# Altium footprint library con-samtec.PCBLIB: 805 footprints (part 52 of 55)
Each footprint in its own frame and in the unit in brackets; x right, y up, seen from the top. Pads: shape width x height; smd on the part's side, far side on the other; paste and mask are expansions set on the pad; w line width, h text height; cw(c..) or ccw(c..) is an arc to the next point about the centre after c.
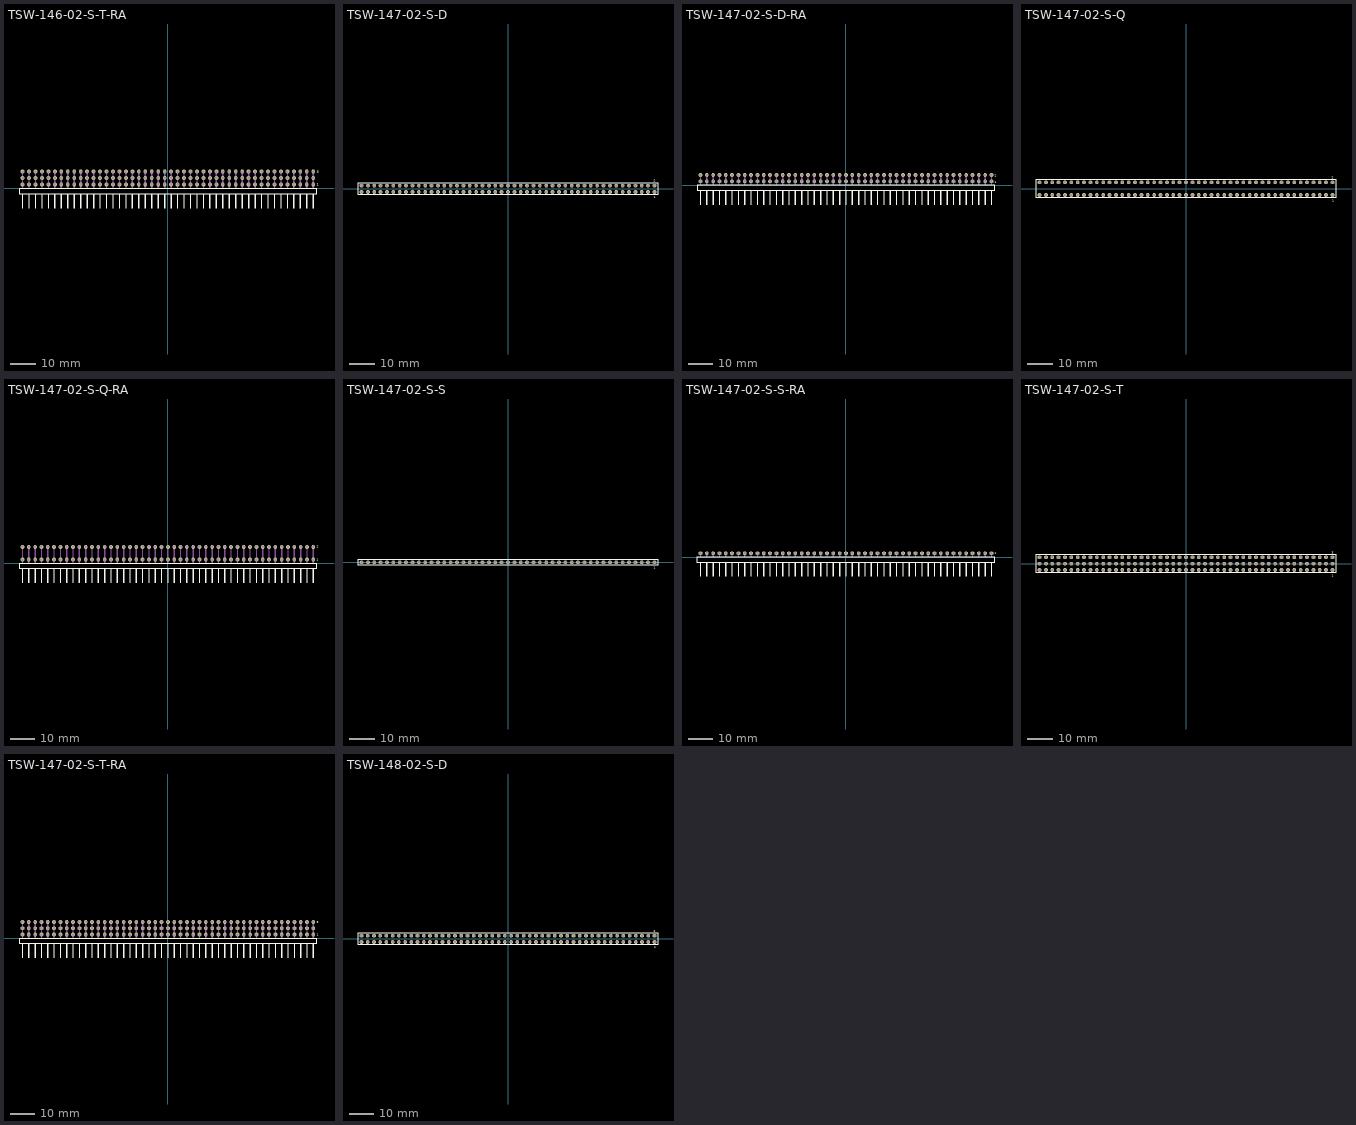
[diagram p51: the footprints below, top view; thin cyan lines are the x and y axes]

## TSW-146-02-S-T-RA [mil]
pads (138):
  oct 59.06x59.06 hole 39.37: 1(2250,60) 2(2250,160) 3(2250,260) 4(2150,60) 5(2150,160) 6(2150,260) 7(2050,60) 8(2050,160) 9(2050,260) 10(1950,60) 11(1950,160) 12(1950,260) 13(1850,60) 14(1850,160) 15(1850,260) 16(1750,60) 17(1750,160) 18(1750,260) 19(1650,60) 20(1650,160) 21(1650,260) 22(1550,60) 23(1550,160) 24(1550,260) 25(1450,60) 26(1450,160) 27(1450,260) 28(1350,60) 29(1350,160) 30(1350,260) 31(1250,60) 32(1250,160) 33(1250,260) 34(1150,60) 35(1150,160) 36(1150,260) 37(1050,60) 38(1050,160) 39(1050,260) 40(950,60) 41(950,160) 42(950,260) 43(850,60) 44(850,160) 45(850,260) 46(750,60) 47(750,160) 48(750,260) 49(650,60) 50(650,160) 51(650,260) 52(550,60) 53(550,160) 54(550,260) 55(450,60) 56(450,160) 57(450,260) 58(350,60) 59(350,160) 60(350,260) 61(250,60) 62(250,160) 63(250,260) 64(150,60) 65(150,160) 66(150,260) 67(50,60) 68(50,160) 69(50,260) 70(-50,60) 71(-50,160) 72(-50,260) 73(-150,60) 74(-150,160) 75(-150,260) 76(-250,60) 77(-250,160) 78(-250,260) 79(-350,60) 80(-350,160) 81(-350,260) 82(-450,60) 83(-450,160) 84(-450,260) 85(-550,60) 86(-550,160) 87(-550,260) 88(-650,60) 89(-650,160) 90(-650,260) 91(-750,60) 92(-750,160) 93(-750,260) 94(-850,60) 95(-850,160) 96(-850,260) 97(-950,60) 98(-950,160) 99(-950,260) 100(-1050,60) 101(-1050,160) 102(-1050,260) 103(-1150,60) 104(-1150,160) 105(-1150,260) 106(-1250,60) 107(-1250,160) 108(-1250,260) 109(-1350,60) 110(-1350,160) 111(-1350,260) 112(-1450,60) 113(-1450,160) 114(-1450,260) 115(-1550,60) 116(-1550,160) 117(-1550,260) 118(-1650,60) 119(-1650,160) 120(-1650,260) 121(-1750,60) 122(-1750,160) 123(-1750,260) 124(-1850,60) 125(-1850,160) 126(-1850,260) 127(-1950,60) 128(-1950,160) 129(-1950,260) 130(-2050,60) 131(-2050,160) 132(-2050,260) 133(-2150,60) 134(-2150,160) 135(-2150,260) 136(-2250,60) 137(-2250,160) 138(-2250,260)
Top Overlay:
  rectangle: -2260,-310.63 -2240,-80.32
  rectangle: -2160,-310.63 -2140,-80.32
  rectangle: -2060,-310.63 -2040,-80.32
  rectangle: -1960,-310.63 -1940,-80.32
  rectangle: -1860,-310.63 -1840,-80.32
  rectangle: -1760,-310.63 -1740,-80.32
  rectangle: -1660,-310.63 -1640,-80.32
  rectangle: -1560,-310.63 -1540,-80.32
  rectangle: -1460,-310.63 -1440,-80.32
  rectangle: -1360,-310.63 -1340,-80.32
  rectangle: -1260,-310.63 -1240,-80.32
  rectangle: -1160,-310.63 -1140,-80.32
  rectangle: -1060,-310.63 -1040,-80.32
  rectangle: -960,-310.63 -940,-80.32
  rectangle: -860,-310.63 -840,-80.32
  rectangle: -760,-310.63 -740,-80.32
  rectangle: -660,-310.63 -640,-80.32
  rectangle: -560,-310.63 -540,-80.32
  rectangle: -460,-310.63 -440,-80.32
  rectangle: -360,-310.63 -340,-80.32
  rectangle: -260,-310.63 -240,-80.32
  rectangle: -160,-310.63 -140,-80.32
  rectangle: -60,-310.63 -40,-80.32
  rectangle: 40,-310.63 60,-80.32
  rectangle: 140,-310.63 160,-80.32
  rectangle: 240,-310.63 260,-80.32
  rectangle: 340,-310.63 360,-80.32
  rectangle: 440,-310.63 460,-80.32
  rectangle: 540,-310.63 560,-80.32
  rectangle: 640,-310.63 660,-80.32
  rectangle: 740,-310.63 760,-80.32
  rectangle: 840,-310.63 860,-80.32
  rectangle: 940,-310.63 960,-80.32
  rectangle: 1040,-310.63 1060,-80.32
  rectangle: 1140,-310.63 1160,-80.32
  rectangle: 1240,-310.63 1260,-80.32
  rectangle: 1340,-310.63 1360,-80.32
  rectangle: 1440,-310.63 1460,-80.32
  rectangle: 1540,-310.63 1560,-80.32
  rectangle: 1640,-310.63 1660,-80.32
  rectangle: 1740,-310.63 1760,-80.32
  rectangle: 1840,-310.63 1860,-80.32
  rectangle: 1940,-310.63 1960,-80.32
  rectangle: 2040,-310.63 2060,-80.32
  rectangle: 2140,-310.63 2160,-80.32
  rectangle: 2240,-310.63 2260,-80.32
  lines w8: -2305.08,-80.55 2305.08,-80.55 2305.08,-4.17 -2305.08,-4.17 -2305.08,-80.55
  text "1" at 2301.57,41.34 h36.81
  text "3" at 2302.17,236.81 h36.81
Mechanical 16:
  rectangle: -2260,0 -2240,270
  rectangle: -2160,0 -2140,270
  rectangle: -2060,0 -2040,270
  rectangle: -1960,0 -1940,270
  rectangle: -1860,0 -1840,270
  rectangle: -1760,0 -1740,270
  rectangle: -1660,0 -1640,270
  rectangle: -1560,0 -1540,270
  rectangle: -1460,0 -1440,270
  rectangle: -1360,0 -1340,270
  rectangle: -1260,0 -1240,270
  rectangle: -1160,0 -1140,270
  rectangle: -1060,0 -1040,270
  rectangle: -960,0 -940,270
  rectangle: -860,0 -840,270
  rectangle: -760,0 -740,270
  rectangle: -660,0 -640,270
  rectangle: -560,0 -540,270
  rectangle: -460,0 -440,270
  rectangle: -360,0 -340,270
  rectangle: -260,0 -240,270
  rectangle: -160,0 -140,270
  rectangle: -60,0 -40,270
  rectangle: 40,0 60,270
  rectangle: 140,0 160,270
  rectangle: 240,0 260,270
  rectangle: 340,0 360,270
  rectangle: 440,0 460,270
  rectangle: 540,0 560,270
  rectangle: 640,0 660,270
  rectangle: 740,0 760,270
  rectangle: 840,0 860,270
  rectangle: 940,0 960,270
  rectangle: 1040,0 1060,270
  rectangle: 1140,0 1160,270
  rectangle: 1240,0 1260,270
  rectangle: 1340,0 1360,270
  rectangle: 1440,0 1460,270
  rectangle: 1540,0 1560,270
  rectangle: 1640,0 1660,270
  rectangle: 1740,0 1760,270
  rectangle: 1840,0 1860,270
  rectangle: 1940,0 1960,270
  rectangle: 2040,0 2060,270
  rectangle: 2140,0 2160,270
  rectangle: 2240,0 2260,270

## TSW-147-02-S-D [mm]
pads (94):
  oct 1.5x1.5 hole 1: 1(58.42,-1.27) 2(58.42,1.27) 3(55.88,-1.27) 4(55.88,1.27) 5(53.34,-1.27) 6(53.34,1.27) 7(50.8,-1.27) 8(50.8,1.27) 9(48.26,-1.27) 10(48.26,1.27) 11(45.72,-1.27) 12(45.72,1.27) 13(43.18,-1.27) 14(43.18,1.27) 15(40.64,-1.27) 16(40.64,1.27) 17(38.1,-1.27) 18(38.1,1.27) 19(35.56,-1.27) 20(35.56,1.27) 21(33.02,-1.27) 22(33.02,1.27) 23(30.48,-1.27) 24(30.48,1.27) 25(27.94,-1.27) 26(27.94,1.27) 27(25.4,-1.27) 28(25.4,1.27) 29(22.86,-1.27) 30(22.86,1.27) 31(20.32,-1.27) 32(20.32,1.27) 33(17.78,-1.27) 34(17.78,1.27) 35(15.24,-1.27) 36(15.24,1.27) 37(12.7,-1.27) 38(12.7,1.27) 39(10.16,-1.27) 40(10.16,1.27) 41(7.62,-1.27) 42(7.62,1.27) 43(5.08,-1.27) 44(5.08,1.27) 45(2.54,-1.27) 46(2.54,1.27) 47(0,-1.27) 48(0,1.27) 49(-2.54,-1.27) 50(-2.54,1.27) 51(-5.08,-1.27) 52(-5.08,1.27) 53(-7.62,-1.27) 54(-7.62,1.27) 55(-10.16,-1.27) 56(-10.16,1.27) 57(-12.7,-1.27) 58(-12.7,1.27) 59(-15.24,-1.27) 60(-15.24,1.27) 61(-17.78,-1.27) 62(-17.78,1.27) 63(-20.32,-1.27) 64(-20.32,1.27) 65(-22.86,-1.27) 66(-22.86,1.27) 67(-25.4,-1.27) 68(-25.4,1.27) 69(-27.94,-1.27) 70(-27.94,1.27) 71(-30.48,-1.27) 72(-30.48,1.27) 73(-33.02,-1.27) 74(-33.02,1.27) 75(-35.56,-1.27) 76(-35.56,1.27) 77(-38.1,-1.27) 78(-38.1,1.27) 79(-40.64,-1.27) 80(-40.64,1.27) 81(-43.18,-1.27) 82(-43.18,1.27) 83(-45.72,-1.27) 84(-45.72,1.27) 85(-48.26,-1.27) 86(-48.26,1.27) 87(-50.8,-1.27) 88(-50.8,1.27) 89(-53.34,-1.27) 90(-53.34,1.27) 91(-55.88,-1.27) 92(-55.88,1.27) 93(-58.42,-1.27) 94(-58.42,1.27)
Top Overlay:
  lines w0.203: -59.819,-2.425 59.819,-2.425 59.819,2.425 -59.819,2.425 -59.819,-2.425
  text "1" at 58.212,-3.818 h0.94
  text "2" at 58.037,2.744 h0.94
Mechanical 16:
  rectangle: -58.77,-1.62 -58.07,-0.92
  rectangle: -58.77,0.92 -58.07,1.62
  rectangle: -56.23,-1.62 -55.53,-0.92
  rectangle: -56.23,0.92 -55.53,1.62
  rectangle: -53.69,-1.62 -52.99,-0.92
  rectangle: -53.69,0.92 -52.99,1.62
  rectangle: -51.15,-1.62 -50.45,-0.92
  rectangle: -51.15,0.92 -50.45,1.62
  rectangle: -48.61,-1.62 -47.91,-0.92
  rectangle: -48.61,0.92 -47.91,1.62
  rectangle: -46.07,-1.62 -45.37,-0.92
  rectangle: -46.07,0.92 -45.37,1.62
  rectangle: -43.53,-1.62 -42.83,-0.92
  rectangle: -43.53,0.92 -42.83,1.62
  rectangle: -40.99,-1.62 -40.29,-0.92
  rectangle: -40.99,0.92 -40.29,1.62
  rectangle: -38.45,-1.62 -37.75,-0.92
  rectangle: -38.45,0.92 -37.75,1.62
  rectangle: -35.91,-1.62 -35.21,-0.92
  rectangle: -35.91,0.92 -35.21,1.62
  rectangle: -33.37,-1.62 -32.67,-0.92
  rectangle: -33.37,0.92 -32.67,1.62
  rectangle: -30.83,-1.62 -30.13,-0.92
  rectangle: -30.83,0.92 -30.13,1.62
  rectangle: -28.29,-1.62 -27.59,-0.92
  rectangle: -28.29,0.92 -27.59,1.62
  rectangle: -25.75,-1.62 -25.05,-0.92
  rectangle: -25.75,0.92 -25.05,1.62
  rectangle: -23.21,-1.62 -22.51,-0.92
  rectangle: -23.21,0.92 -22.51,1.62
  rectangle: -20.67,-1.62 -19.97,-0.92
  rectangle: -20.67,0.92 -19.97,1.62
  rectangle: -18.13,-1.62 -17.43,-0.92
  rectangle: -18.13,0.92 -17.43,1.62
  rectangle: -15.59,-1.62 -14.89,-0.92
  rectangle: -15.59,0.92 -14.89,1.62
  rectangle: -13.05,-1.62 -12.35,-0.92
  rectangle: -13.05,0.92 -12.35,1.62
  rectangle: -10.51,-1.62 -9.81,-0.92
  rectangle: -10.51,0.92 -9.81,1.62
  rectangle: -7.97,-1.62 -7.27,-0.92
  rectangle: -7.97,0.92 -7.27,1.62
  rectangle: -5.43,-1.62 -4.73,-0.92
  rectangle: -5.43,0.92 -4.73,1.62
  rectangle: -2.89,-1.62 -2.19,-0.92
  rectangle: -2.89,0.92 -2.19,1.62
  rectangle: -0.35,-1.62 0.35,-0.92
  rectangle: -0.35,0.92 0.35,1.62
  rectangle: 2.19,-1.62 2.89,-0.92
  rectangle: 2.19,0.92 2.89,1.62
  rectangle: 4.73,-1.62 5.43,-0.92
  rectangle: 4.73,0.92 5.43,1.62
  rectangle: 7.27,-1.62 7.97,-0.92
  rectangle: 7.27,0.92 7.97,1.62
  rectangle: 9.81,-1.62 10.51,-0.92
  rectangle: 9.81,0.92 10.51,1.62
  rectangle: 12.35,-1.62 13.05,-0.92
  rectangle: 12.35,0.92 13.05,1.62
  rectangle: 14.89,-1.62 15.59,-0.92
  rectangle: 14.89,0.92 15.59,1.62
  rectangle: 17.43,-1.62 18.13,-0.92
  rectangle: 17.43,0.92 18.13,1.62
  rectangle: 19.97,-1.62 20.67,-0.92
  rectangle: 19.97,0.92 20.67,1.62
  rectangle: 22.51,-1.62 23.21,-0.92
  rectangle: 22.51,0.92 23.21,1.62
  rectangle: 25.05,-1.62 25.75,-0.92
  rectangle: 25.05,0.92 25.75,1.62
  rectangle: 27.59,-1.62 28.29,-0.92
  rectangle: 27.59,0.92 28.29,1.62
  rectangle: 30.13,-1.62 30.83,-0.92
  rectangle: 30.13,0.92 30.83,1.62
  rectangle: 32.67,-1.62 33.37,-0.92
  rectangle: 32.67,0.92 33.37,1.62
  rectangle: 35.21,-1.62 35.91,-0.92
  rectangle: 35.21,0.92 35.91,1.62
  rectangle: 37.75,-1.62 38.45,-0.92
  rectangle: 37.75,0.92 38.45,1.62
  rectangle: 40.29,-1.62 40.99,-0.92
  rectangle: 40.29,0.92 40.99,1.62
  rectangle: 42.83,-1.62 43.53,-0.92
  rectangle: 42.83,0.92 43.53,1.62
  rectangle: 45.37,-1.62 46.07,-0.92
  rectangle: 45.37,0.92 46.07,1.62
  rectangle: 47.91,-1.62 48.61,-0.92
  rectangle: 47.91,0.92 48.61,1.62
  rectangle: 50.45,-1.62 51.15,-0.92
  rectangle: 50.45,0.92 51.15,1.62
  rectangle: 52.99,-1.62 53.69,-0.92
  rectangle: 52.99,0.92 53.69,1.62
  rectangle: 55.53,-1.62 56.23,-0.92
  rectangle: 55.53,0.92 56.23,1.62
  rectangle: 58.07,-1.62 58.77,-0.92
  rectangle: 58.07,0.92 58.77,1.62

## TSW-147-02-S-D-RA [mil]
pads (94):
  oct 59.06x59.06 hole 39.37: 1(2300,60) 2(2300,160) 3(2200,60) 4(2200,160) 5(2100,60) 6(2100,160) 7(2000,60) 8(2000,160) 9(1900,60) 10(1900,160) 11(1800,60) 12(1800,160) 13(1700,60) 14(1700,160) 15(1600,60) 16(1600,160) 17(1500,60) 18(1500,160) 19(1400,60) 20(1400,160) 21(1300,60) 22(1300,160) 23(1200,60) 24(1200,160) 25(1100,60) 26(1100,160) 27(1000,60) 28(1000,160) 29(900,60) 30(900,160) 31(800,60) 32(800,160) 33(700,60) 34(700,160) 35(600,60) 36(600,160) 37(500,60) 38(500,160) 39(400,60) 40(400,160) 41(300,60) 42(300,160) 43(200,60) 44(200,160) 45(100,60) 46(100,160) 47(0,60) 48(0,160) 49(-100,60) 50(-100,160) 51(-200,60) 52(-200,160) 53(-300,60) 54(-300,160) 55(-400,60) 56(-400,160) 57(-500,60) 58(-500,160) 59(-600,60) 60(-600,160) 61(-700,60) 62(-700,160) 63(-800,60) 64(-800,160) 65(-900,60) 66(-900,160) 67(-1000,60) 68(-1000,160) 69(-1100,60) 70(-1100,160) 71(-1200,60) 72(-1200,160) 73(-1300,60) 74(-1300,160) 75(-1400,60) 76(-1400,160) 77(-1500,60) 78(-1500,160) 79(-1600,60) 80(-1600,160) 81(-1700,60) 82(-1700,160) 83(-1800,60) 84(-1800,160) 85(-1900,60) 86(-1900,160) 87(-2000,60) 88(-2000,160) 89(-2100,60) 90(-2100,160) 91(-2200,60) 92(-2200,160) 93(-2300,60) 94(-2300,160)
Top Overlay:
  rectangle: -2310,-310.63 -2290,-80.32
  rectangle: -2210,-310.63 -2190,-80.32
  rectangle: -2110,-310.63 -2090,-80.32
  rectangle: -2010,-310.63 -1990,-80.32
  rectangle: -1910,-310.63 -1890,-80.32
  rectangle: -1810,-310.63 -1790,-80.32
  rectangle: -1710,-310.63 -1690,-80.32
  rectangle: -1610,-310.63 -1590,-80.32
  rectangle: -1510,-310.63 -1490,-80.32
  rectangle: -1410,-310.63 -1390,-80.32
  rectangle: -1310,-310.63 -1290,-80.32
  rectangle: -1210,-310.63 -1190,-80.32
  rectangle: -1110,-310.63 -1090,-80.32
  rectangle: -1010,-310.63 -990,-80.32
  rectangle: -910,-310.63 -890,-80.32
  rectangle: -810,-310.63 -790,-80.32
  rectangle: -710,-310.63 -690,-80.32
  rectangle: -610,-310.63 -590,-80.32
  rectangle: -510,-310.63 -490,-80.32
  rectangle: -410,-310.63 -390,-80.32
  rectangle: -310,-310.63 -290,-80.32
  rectangle: -210,-310.63 -190,-80.32
  rectangle: -110,-310.63 -90,-80.32
  rectangle: -10,-310.63 10,-80.32
  rectangle: 90,-310.63 110,-80.32
  rectangle: 190,-310.63 210,-80.32
  rectangle: 290,-310.63 310,-80.32
  rectangle: 390,-310.63 410,-80.32
  rectangle: 490,-310.63 510,-80.32
  rectangle: 590,-310.63 610,-80.32
  rectangle: 690,-310.63 710,-80.32
  rectangle: 790,-310.63 810,-80.32
  rectangle: 890,-310.63 910,-80.32
  rectangle: 990,-310.63 1010,-80.32
  rectangle: 1090,-310.63 1110,-80.32
  rectangle: 1190,-310.63 1210,-80.32
  rectangle: 1290,-310.63 1310,-80.32
  rectangle: 1390,-310.63 1410,-80.32
  rectangle: 1490,-310.63 1510,-80.32
  rectangle: 1590,-310.63 1610,-80.32
  rectangle: 1690,-310.63 1710,-80.32
  rectangle: 1790,-310.63 1810,-80.32
  rectangle: 1890,-310.63 1910,-80.32
  rectangle: 1990,-310.63 2010,-80.32
  rectangle: 2090,-310.63 2110,-80.32
  rectangle: 2190,-310.63 2210,-80.32
  rectangle: 2290,-310.63 2310,-80.32
  lines w8: -2355.08,-80.55 2355.08,-80.55 2355.08,-4.17 -2355.08,-4.17 -2355.08,-80.55
  text "1" at 2350.59,30.51 h36.81
  text "2" at 2349.21,129.53 h36.81
Mechanical 16:
  rectangle: -2310,0 -2290,170
  rectangle: -2210,0 -2190,170
  rectangle: -2110,0 -2090,170
  rectangle: -2010,0 -1990,170
  rectangle: -1910,0 -1890,170
  rectangle: -1810,0 -1790,170
  rectangle: -1710,0 -1690,170
  rectangle: -1610,0 -1590,170
  rectangle: -1510,0 -1490,170
  rectangle: -1410,0 -1390,170
  rectangle: -1310,0 -1290,170
  rectangle: -1210,0 -1190,170
  rectangle: -1110,0 -1090,170
  rectangle: -1010,0 -990,170
  rectangle: -910,0 -890,170
  rectangle: -810,0 -790,170
  rectangle: -710,0 -690,170
  rectangle: -610,0 -590,170
  rectangle: -510,0 -490,170
  rectangle: -410,0 -390,170
  rectangle: -310,0 -290,170
  rectangle: -210,0 -190,170
  rectangle: -110,0 -90,170
  rectangle: -10,0 10,170
  rectangle: 90,0 110,170
  rectangle: 190,0 210,170
  rectangle: 290,0 310,170
  rectangle: 390,0 410,170
  rectangle: 490,0 510,170
  rectangle: 590,0 610,170
  rectangle: 690,0 710,170
  rectangle: 790,0 810,170
  rectangle: 890,0 910,170
  rectangle: 990,0 1010,170
  rectangle: 1090,0 1110,170
  rectangle: 1190,0 1210,170
  rectangle: 1290,0 1310,170
  rectangle: 1390,0 1410,170
  rectangle: 1490,0 1510,170
  rectangle: 1590,0 1610,170
  rectangle: 1690,0 1710,170
  rectangle: 1790,0 1810,170
  rectangle: 1890,0 1910,170
  rectangle: 1990,0 2010,170
  rectangle: 2090,0 2110,170
  rectangle: 2190,0 2210,170
  rectangle: 2290,0 2310,170

## TSW-147-02-S-Q [mm]
pads (94):
  oct 1.5x1.5 hole 1: 1(58.42,-2.54) 2(58.42,2.54) 3(55.88,-2.54) 4(55.88,2.54) 5(53.34,-2.54) 6(53.34,2.54) 7(50.8,-2.54) 8(50.8,2.54) 9(48.26,-2.54) 10(48.26,2.54) 11(45.72,-2.54) 12(45.72,2.54) 13(43.18,-2.54) 14(43.18,2.54) 15(40.64,-2.54) 16(40.64,2.54) 17(38.1,-2.54) 18(38.1,2.54) 19(35.56,-2.54) 20(35.56,2.54) 21(33.02,-2.54) 22(33.02,2.54) 23(30.48,-2.54) 24(30.48,2.54) 25(27.94,-2.54) 26(27.94,2.54) 27(25.4,-2.54) 28(25.4,2.54) 29(22.86,-2.54) 30(22.86,2.54) 31(20.32,-2.54) 32(20.32,2.54) 33(17.78,-2.54) 34(17.78,2.54) 35(15.24,-2.54) 36(15.24,2.54) 37(12.7,-2.54) 38(12.7,2.54) 39(10.16,-2.54) 40(10.16,2.54) 41(7.62,-2.54) 42(7.62,2.54) 43(5.08,-2.54) 44(5.08,2.54) 45(2.54,-2.54) 46(2.54,2.54) 47(0,-2.54) 48(0,2.54) 49(-2.54,-2.54) 50(-2.54,2.54) 51(-5.08,-2.54) 52(-5.08,2.54) 53(-7.62,-2.54) 54(-7.62,2.54) 55(-10.16,-2.54) 56(-10.16,2.54) 57(-12.7,-2.54) 58(-12.7,2.54) 59(-15.24,-2.54) 60(-15.24,2.54) 61(-17.78,-2.54) 62(-17.78,2.54) 63(-20.32,-2.54) 64(-20.32,2.54) 65(-22.86,-2.54) 66(-22.86,2.54) 67(-25.4,-2.54) 68(-25.4,2.54) 69(-27.94,-2.54) 70(-27.94,2.54) 71(-30.48,-2.54) 72(-30.48,2.54) 73(-33.02,-2.54) 74(-33.02,2.54) 75(-35.56,-2.54) 76(-35.56,2.54) 77(-38.1,-2.54) 78(-38.1,2.54) 79(-40.64,-2.54) 80(-40.64,2.54) 81(-43.18,-2.54) 82(-43.18,2.54) 83(-45.72,-2.54) 84(-45.72,2.54) 85(-48.26,-2.54) 86(-48.26,2.54) 87(-50.8,-2.54) 88(-50.8,2.54) 89(-53.34,-2.54) 90(-53.34,2.54) 91(-55.88,-2.54) 92(-55.88,2.54) 93(-58.42,-2.54) 94(-58.42,2.54)
Top Overlay:
  lines w0.203: -59.819,-3.695 59.819,-3.695 59.819,3.695 -59.819,3.695 -59.819,-3.695
  text "1" at 58.262,-5.138 h0.94
  text "2" at 58.162,3.989 h0.94
Mechanical 16:
  rectangle: -58.77,-2.89 -58.07,-2.19
  rectangle: -58.77,2.19 -58.07,2.89
  rectangle: -56.23,-2.89 -55.53,-2.19
  rectangle: -56.23,2.19 -55.53,2.89
  rectangle: -53.69,-2.89 -52.99,-2.19
  rectangle: -53.69,2.19 -52.99,2.89
  rectangle: -51.15,-2.89 -50.45,-2.19
  rectangle: -51.15,2.19 -50.45,2.89
  rectangle: -48.61,-2.89 -47.91,-2.19
  rectangle: -48.61,2.19 -47.91,2.89
  rectangle: -46.07,-2.89 -45.37,-2.19
  rectangle: -46.07,2.19 -45.37,2.89
  rectangle: -43.53,-2.89 -42.83,-2.19
  rectangle: -43.53,2.19 -42.83,2.89
  rectangle: -40.99,-2.89 -40.29,-2.19
  rectangle: -40.99,2.19 -40.29,2.89
  rectangle: -38.45,-2.89 -37.75,-2.19
  rectangle: -38.45,2.19 -37.75,2.89
  rectangle: -35.91,-2.89 -35.21,-2.19
  rectangle: -35.91,2.19 -35.21,2.89
  rectangle: -33.37,-2.89 -32.67,-2.19
  rectangle: -33.37,2.19 -32.67,2.89
  rectangle: -30.83,-2.89 -30.13,-2.19
  rectangle: -30.83,2.19 -30.13,2.89
  rectangle: -28.29,-2.89 -27.59,-2.19
  rectangle: -28.29,2.19 -27.59,2.89
  rectangle: -25.75,-2.89 -25.05,-2.19
  rectangle: -25.75,2.19 -25.05,2.89
  rectangle: -23.21,-2.89 -22.51,-2.19
  rectangle: -23.21,2.19 -22.51,2.89
  rectangle: -20.67,-2.89 -19.97,-2.19
  rectangle: -20.67,2.19 -19.97,2.89
  rectangle: -18.13,-2.89 -17.43,-2.19
  rectangle: -18.13,2.19 -17.43,2.89
  rectangle: -15.59,-2.89 -14.89,-2.19
  rectangle: -15.59,2.19 -14.89,2.89
  rectangle: -13.05,-2.89 -12.35,-2.19
  rectangle: -13.05,2.19 -12.35,2.89
  rectangle: -10.51,-2.89 -9.81,-2.19
  rectangle: -10.51,2.19 -9.81,2.89
  rectangle: -7.97,-2.89 -7.27,-2.19
  rectangle: -7.97,2.19 -7.27,2.89
  rectangle: -5.43,-2.89 -4.73,-2.19
  rectangle: -5.43,2.19 -4.73,2.89
  rectangle: -2.89,-2.89 -2.19,-2.19
  rectangle: -2.89,2.19 -2.19,2.89
  rectangle: -0.35,-2.89 0.35,-2.19
  rectangle: -0.35,2.19 0.35,2.89
  rectangle: 2.19,-2.89 2.89,-2.19
  rectangle: 2.19,2.19 2.89,2.89
  rectangle: 4.73,-2.89 5.43,-2.19
  rectangle: 4.73,2.19 5.43,2.89
  rectangle: 7.27,-2.89 7.97,-2.19
  rectangle: 7.27,2.19 7.97,2.89
  rectangle: 9.81,-2.89 10.51,-2.19
  rectangle: 9.81,2.19 10.51,2.89
  rectangle: 12.35,-2.89 13.05,-2.19
  rectangle: 12.35,2.19 13.05,2.89
  rectangle: 14.89,-2.89 15.59,-2.19
  rectangle: 14.89,2.19 15.59,2.89
  rectangle: 17.43,-2.89 18.13,-2.19
  rectangle: 17.43,2.19 18.13,2.89
  rectangle: 19.97,-2.89 20.67,-2.19
  rectangle: 19.97,2.19 20.67,2.89
  rectangle: 22.51,-2.89 23.21,-2.19
  rectangle: 22.51,2.19 23.21,2.89
  rectangle: 25.05,-2.89 25.75,-2.19
  rectangle: 25.05,2.19 25.75,2.89
  rectangle: 27.59,-2.89 28.29,-2.19
  rectangle: 27.59,2.19 28.29,2.89
  rectangle: 30.13,-2.89 30.83,-2.19
  rectangle: 30.13,2.19 30.83,2.89
  rectangle: 32.67,-2.89 33.37,-2.19
  rectangle: 32.67,2.19 33.37,2.89
  rectangle: 35.21,-2.89 35.91,-2.19
  rectangle: 35.21,2.19 35.91,2.89
  rectangle: 37.75,-2.89 38.45,-2.19
  rectangle: 37.75,2.19 38.45,2.89
  rectangle: 40.29,-2.89 40.99,-2.19
  rectangle: 40.29,2.19 40.99,2.89
  rectangle: 42.83,-2.89 43.53,-2.19
  rectangle: 42.83,2.19 43.53,2.89
  rectangle: 45.37,-2.89 46.07,-2.19
  rectangle: 45.37,2.19 46.07,2.89
  rectangle: 47.91,-2.89 48.61,-2.19
  rectangle: 47.91,2.19 48.61,2.89
  rectangle: 50.45,-2.89 51.15,-2.19
  rectangle: 50.45,2.19 51.15,2.89
  rectangle: 52.99,-2.89 53.69,-2.19
  rectangle: 52.99,2.19 53.69,2.89
  rectangle: 55.53,-2.89 56.23,-2.19
  rectangle: 55.53,2.19 56.23,2.89
  rectangle: 58.07,-2.89 58.77,-2.19
  rectangle: 58.07,2.19 58.77,2.89

## TSW-147-02-S-Q-RA [mil]
pads (94):
  oct 59.06x59.06 hole 39.37: 1(2300,60) 2(2300,260) 3(2200,60) 4(2200,260) 5(2100,60) 6(2100,260) 7(2000,60) 8(2000,260) 9(1900,60) 10(1900,260) 11(1800,60) 12(1800,260) 13(1700,60) 14(1700,260) 15(1600,60) 16(1600,260) 17(1500,60) 18(1500,260) 19(1400,60) 20(1400,260) 21(1300,60) 22(1300,260) 23(1200,60) 24(1200,260) 25(1100,60) 26(1100,260) 27(1000,60) 28(1000,260) 29(900,60) 30(900,260) 31(800,60) 32(800,260) 33(700,60) 34(700,260) 35(600,60) 36(600,260) 37(500,60) 38(500,260) 39(400,60) 40(400,260) 41(300,60) 42(300,260) 43(200,60) 44(200,260) 45(100,60) 46(100,260) 47(0,60) 48(0,260) 49(-100,60) 50(-100,260) 51(-200,60) 52(-200,260) 53(-300,60) 54(-300,260) 55(-400,60) 56(-400,260) 57(-500,60) 58(-500,260) 59(-600,60) 60(-600,260) 61(-700,60) 62(-700,260) 63(-800,60) 64(-800,260) 65(-900,60) 66(-900,260) 67(-1000,60) 68(-1000,260) 69(-1100,60) 70(-1100,260) 71(-1200,60) 72(-1200,260) 73(-1300,60) 74(-1300,260) 75(-1400,60) 76(-1400,260) 77(-1500,60) 78(-1500,260) 79(-1600,60) 80(-1600,260) 81(-1700,60) 82(-1700,260) 83(-1800,60) 84(-1800,260) 85(-1900,60) 86(-1900,260) 87(-2000,60) 88(-2000,260) 89(-2100,60) 90(-2100,260) 91(-2200,60) 92(-2200,260) 93(-2300,60) 94(-2300,260)
Top Overlay:
  rectangle: -2310,-310.63 -2290,-80.32
  rectangle: -2210,-310.63 -2190,-80.32
  rectangle: -2110,-310.63 -2090,-80.32
  rectangle: -2010,-310.63 -1990,-80.32
  rectangle: -1910,-310.63 -1890,-80.32
  rectangle: -1810,-310.63 -1790,-80.32
  rectangle: -1710,-310.63 -1690,-80.32
  rectangle: -1610,-310.63 -1590,-80.32
  rectangle: -1510,-310.63 -1490,-80.32
  rectangle: -1410,-310.63 -1390,-80.32
  rectangle: -1310,-310.63 -1290,-80.32
  rectangle: -1210,-310.63 -1190,-80.32
  rectangle: -1110,-310.63 -1090,-80.32
  rectangle: -1010,-310.63 -990,-80.32
  rectangle: -910,-310.63 -890,-80.32
  rectangle: -810,-310.63 -790,-80.32
  rectangle: -710,-310.63 -690,-80.32
  rectangle: -610,-310.63 -590,-80.32
  rectangle: -510,-310.63 -490,-80.32
  rectangle: -410,-310.63 -390,-80.32
  rectangle: -310,-310.63 -290,-80.32
  rectangle: -210,-310.63 -190,-80.32
  rectangle: -110,-310.63 -90,-80.32
  rectangle: -10,-310.63 10,-80.32
  rectangle: 90,-310.63 110,-80.32
  rectangle: 190,-310.63 210,-80.32
  rectangle: 290,-310.63 310,-80.32
  rectangle: 390,-310.63 410,-80.32
  rectangle: 490,-310.63 510,-80.32
  rectangle: 590,-310.63 610,-80.32
  rectangle: 690,-310.63 710,-80.32
  rectangle: 790,-310.63 810,-80.32
  rectangle: 890,-310.63 910,-80.32
  rectangle: 990,-310.63 1010,-80.32
  rectangle: 1090,-310.63 1110,-80.32
  rectangle: 1190,-310.63 1210,-80.32
  rectangle: 1290,-310.63 1310,-80.32